# Altium footprint library connectors_socets.pcblib: 567 footprints (part 36 of 36)
Each footprint in its own frame and in the unit in brackets; x right, y up, seen from the top. Pads: shape width x height; smd on the part's side, far side on the other; paste and mask are expansions set on the pad; w line width, h text height; cw(c..) or ccw(c..) is an arc to the next point about the centre after c.
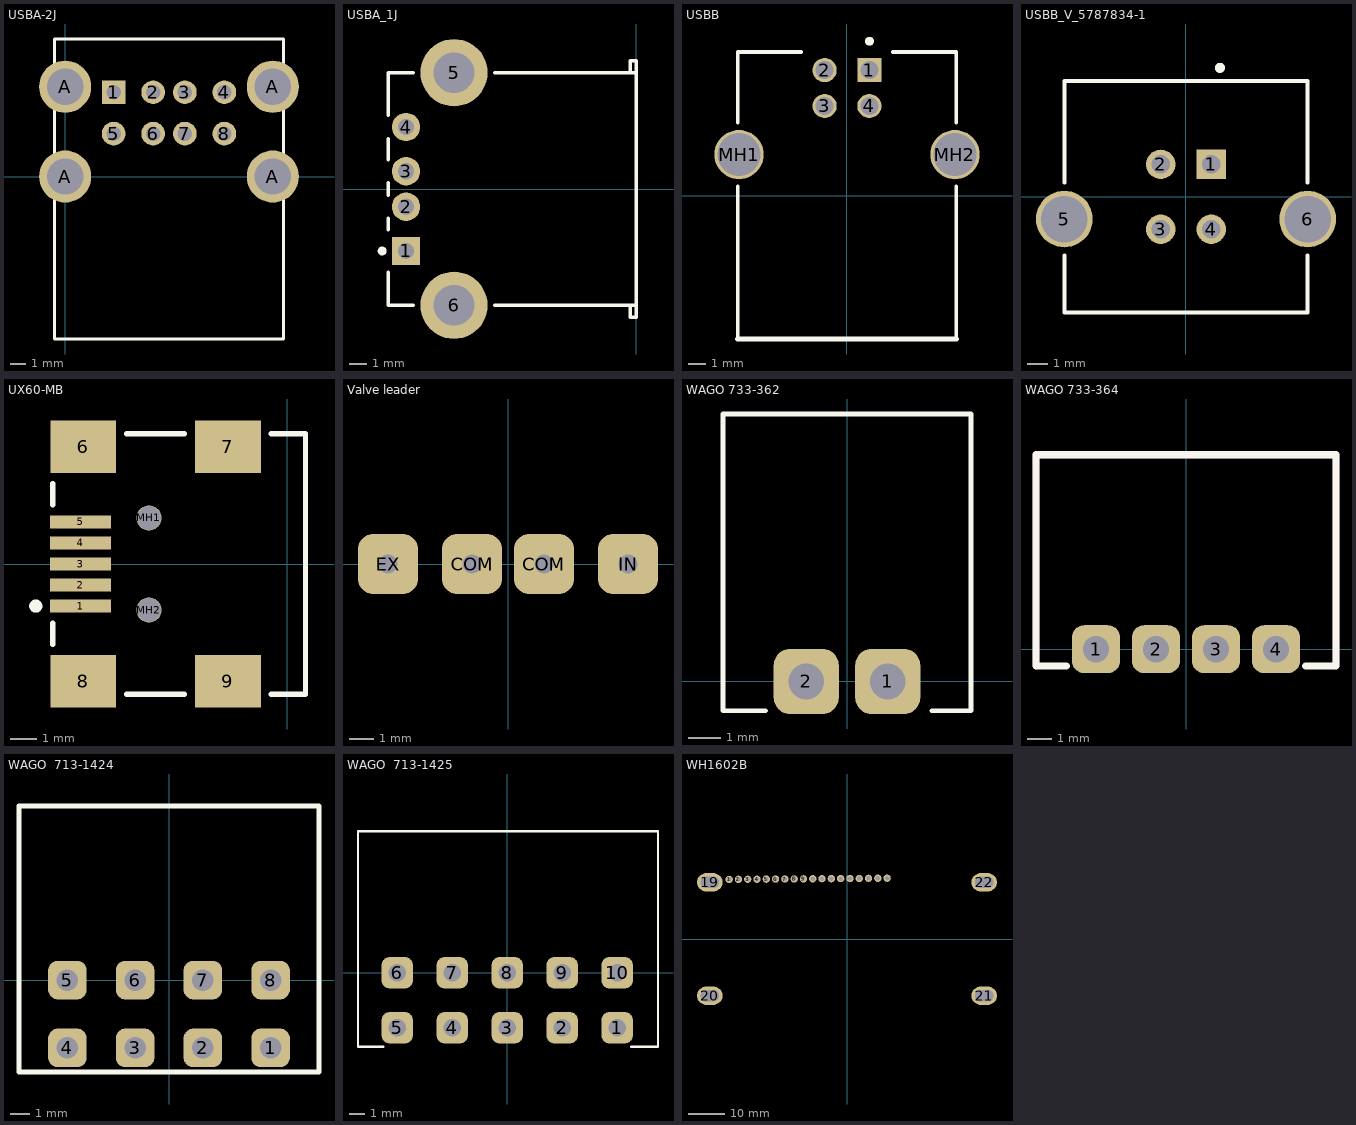
[diagram p35: the footprints below, top view; thin cyan lines are the x and y axes]

## USBA-2J [mm] "Dual port USB connector"
pads (12):
  rect 1.5x1.5 hole 0.92: 1(3.07,5.33)
  round 1.5 hole 0.92: 2(5.57,5.33) 3(7.57,5.33) 4(10.07,5.33) 5(3.07,2.71) 6(5.57,2.71) 7(7.57,2.71) 8(10.07,2.71)
  round 3.3 hole 2.3: A(0,0) A(0,5.68) A(13.14,0) A(13.14,5.68)
Top Overlay:
  lines w0.2: -0.68,-10.28 -0.68,8.7 13.82,8.7 13.82,-10.28 -0.68,-10.28
3D body "USBA-2J.STEP": height 16.15, standoff -3.99, extent -1.6,-10.29 14.659,6.89

## USBA_1J [mm] "Connector; USB1.1, Reverse Type, Thru-Hole; 4 Position; Right Angle"
height 6.95
pads (6):
  rect 1.6x1.6 hole 0.92: 1(-12.99,-3.5)
  round 1.6 hole 0.92: 2(-12.99,-1) 3(-12.99,1) 4(-12.99,3.5)
  round 3.8 hole 2.3: 5(-10.28,6.57) 6(-10.28,-6.57)
Top Overlay:
  circle w0.25: c-14.34,-3.5 r0.125
  lines w0.2: -14,-4.7 -14,-6.565 -12.58,-6.565 ; -14,-2.3 -14,-1.66 ; -14,-0.34 -14,0.34 ; -14,1.66 -14,2.84 ; -14,4.16 -14,6.565 -12.58,6.565 ; -7.98,-6.565 0,-6.565 ; -7.98,6.565 0,6.565 ; -0.32,-6.565 -0.32,-7.25 0,-7.25 0,-6.565 ; -0.32,6.565 -0.32,7.25 0,7.25 0,6.565 ; 0,-6.565 0,6.565
3D body "USB-1A.STEP": height 7.66, standoff -3.62, extent -14,-8.117 0,8.117

## USBB [mm]
pads (6):
  rect 1.35x1.35 hole 1: 1(1.254,6.99)
  round 1.35 hole 1: 2(-1.246,6.99) 3(-1.246,4.99) 4(1.254,4.99)
  round 2.75 hole 2.4: MH1(-6.016,2.28) MH2(6.024,2.28)
Top Overlay:
  circle w0.25: c1.254,8.6 r0.125
  lines w0.2: -6.096,-8 -6.096,0.507 ; -6.096,4.053 -6.096,8 -2.54,8 ; 2.548,8 6.104,8 6.104,4.053 ; 6.104,-8 6.104,0.507
  lines w0.3: -6.096,-8 6.104,-8
3D body "User Library-Samtec - USB-B-S-X-W-TH.STEP": height 11, standoff -3.64, extent -7.4,-8 7.399,8.5
3D body: height 0, standoff -2.84, extent -1.445,4.791 -1.047,5.189
3D body: height 0, standoff -2.84, extent 1.055,4.791 1.453,5.189
3D body: height 0, standoff -2.84, extent 1.055,6.791 1.453,7.189
3D body: height 0, standoff -2.84, extent -1.445,6.791 -1.047,7.189

## USBB_V_5787834-1 [mm] "USBB_V_5787834-1"
pads (6):
  rect 1.45x1.45 hole 0.92: 1(1.25,1.605)
  round 1.45 hole 0.92: 2(-1.25,1.605) 3(-1.25,-1.605) 4(1.25,-1.605)
  round 2.8 hole 2.3: 5(-6.02,-1.1) 6(6.02,-1.1)
Top Overlay:
  circle w0.25: c1.68,6.38 r0.125
  lines w0.2: -6.015,-2.9 -6.015,-5.73 6.015,-5.73 6.015,-2.9 ; -6.015,0.7 -6.015,5.73 6.015,5.73 6.015,0.7
Plata3D:
  lines w0.1: -6.015,-5.73 6.015,-5.73 ; -6.015,5.73 6.015,5.73
3D body "c-5787834-1-1-3d.stp": height 15.62, standoff -3.92, extent -7.575,-5.728 7.575,5.728

## UX60-MB [mm] "Connector; USB2.0, Type B, SM; 5 Position; Right Angle"
height 3.9
pads (11):
  rect 2.3x0.5 smd: 1(-7.85,-1.6) 2(-7.85,-0.8) 3(-7.85,0) 4(-7.85,0.8) 5(-7.85,1.6)
  rect 2.5x2 smd: 6(-7.75,4.45) 7(-2.25,4.45) 8(-7.75,-4.45) 9(-2.25,-4.45)
  round 0.95 hole 0.9 unplated: MH1(-5.25,1.75) MH2(-5.25,-1.75)
Top Overlay:
  circle w0.25: c-9.55,-1.6 r0.125
  lines w0.2: -8.9,-3.05 -8.9,-2.25 ; -8.9,2.25 -8.9,3.05 ; -6.1,-4.95 -3.9,-4.95 ; -6.1,4.95 -3.9,4.95 ; -0.6,-4.95 0.7,-4.95 0.7,4.95 -0.6,4.95
3D body "mini-usb2.stp": height 3.93, standoff -0.05, extent -8.825,-5.1 0.425,4.8

## Valve leader [mm]
pads (4):
  rrect50% 2.5x2.5 hole 0.8 unplated: COM(-1.5,0) COM(1.5,0) EX(-5,0) IN(5,0)

## WAGO 733-362 [mm] "PCB Connectror"
pads (2):
  rrect50% 2x2 hole 1.1: 1(1.25,0)
  rrect50% 2x2 hole 1.1 unplated: 2(-1.25,0)
Top Overlay:
  lines w0.15: -2.5,-0.9 -3.8,-0.9 -3.8,8.2 3.8,8.2 3.8,-0.8 3.8,-0.9 2.6,-0.9
3D body "733-362.stp": height 7.8, standoff -3.7, extent -3.75,-0.8 3.75,8.1

## WAGO 733-364 [mm] "PCB Connectror"
pads (4):
  rrect50% 2x2 hole 1.1: 1(-3.75,0) 2(-1.25,0) 3(1.25,0) 4(3.75,0)
Top Overlay:
  lines w0.3: -4.975,-0.7 -6.25,-0.7 ; 4.975,-0.7 6.25,-0.7 6.25,8.1 -6.25,8.1 -6.25,-0.7 ; -6.25,-0.7 -6.25,-0.7
Top3D:
  lines w0.3: -6.25,-0.7 -6.25,8.1 0,8.1 6.25,8.1 6.25,-0.7
3D body "733-364.stp": height 7.8, standoff -3.7, extent -6.25,-0.8 6.25,8.1

## WAGO  713-1424 [mm] "PCB Connectror"
pads (8):
  rrect50% 2x2 hole 1.1: 1(5.25,-3.5) 2(1.75,-3.5) 3(-1.75,-3.5) 4(-5.25,-3.5) 5(-5.25,0) 6(-1.75,0) 7(1.75,0) 8(5.25,0)
Top Overlay:
  lines w0.254: -7.75,9 -7.75,-4.75 0,-4.75 7.75,-4.75 7.75,9 -7.75,9 ; -7.75,9 -7.75,9
3D body "713-1424.stp": height 13.3, standoff -3.8, extent -7.75,-4.6 7.75,8.9

## WAGO  713-1425 [mm] "PCB Connectror"
pads (10):
  rrect50% 2x2 hole 1.1: 1(7,-3.5) 2(3.5,-3.5) 3(0,-3.5) 4(-3.5,-3.5) 5(-7,-3.5) 6(-7,0) 7(-3.5,0) 8(0,0) 9(3.5,0) 10(7,0)
Top Overlay:
  lines w0.15: -7.9,-4.7 -9.5,-4.7 -9.5,9 ; 7.9,-4.7 9.6,-4.7 9.6,9 -9.5,9 ; -9.5,9 -9.5,9
3D body "713-1425_105-000.stp": height 13.3, standoff -2.4, extent -9.5,-4.6 9.5,8.9

## WH1602B [mm] "WH1602B"
pads (22):
  round 2 hole 1.2: 1(-32.22,16.28) 2(-29.68,16.3) 3(-27.14,16.32) 4(-24.6,16.34) 5(-22.06,16.36) 6(-19.52,16.38) 7(-16.98,16.4) 8(-14.44,16.42) 9(-11.9,16.44) 10(-9.36,16.46) 11(-6.82,16.48) 12(-4.28,16.5) 13(-1.74,16.52) 14(0.8,16.54) 15(3.34,16.56) 16(5.88,16.58) 17(8.42,16.6) 18(10.96,16.62)
  rrect100% 7x5 hole 3 slot 5 at 0 deg: 19(-37.5,15.5) 20(-37.5,-15.5) 21(37.5,-15.5) 22(37.5,15.5)
3D body "WH1602B.stp": height 21.52, standoff 8.31, extent -40.25,-18.25 40.25,18.25